# Altium footprint library Footprints.PcbLib: 45 footprints (part 1 of 3)
Each footprint in its own frame and in the unit in brackets; x right, y up, seen from the top. Pads: shape width x height; smd on the part's side, far side on the other; paste and mask are expansions set on the pad; w line width, h text height; cw(c..) or ccw(c..) is an arc to the next point about the centre after c.
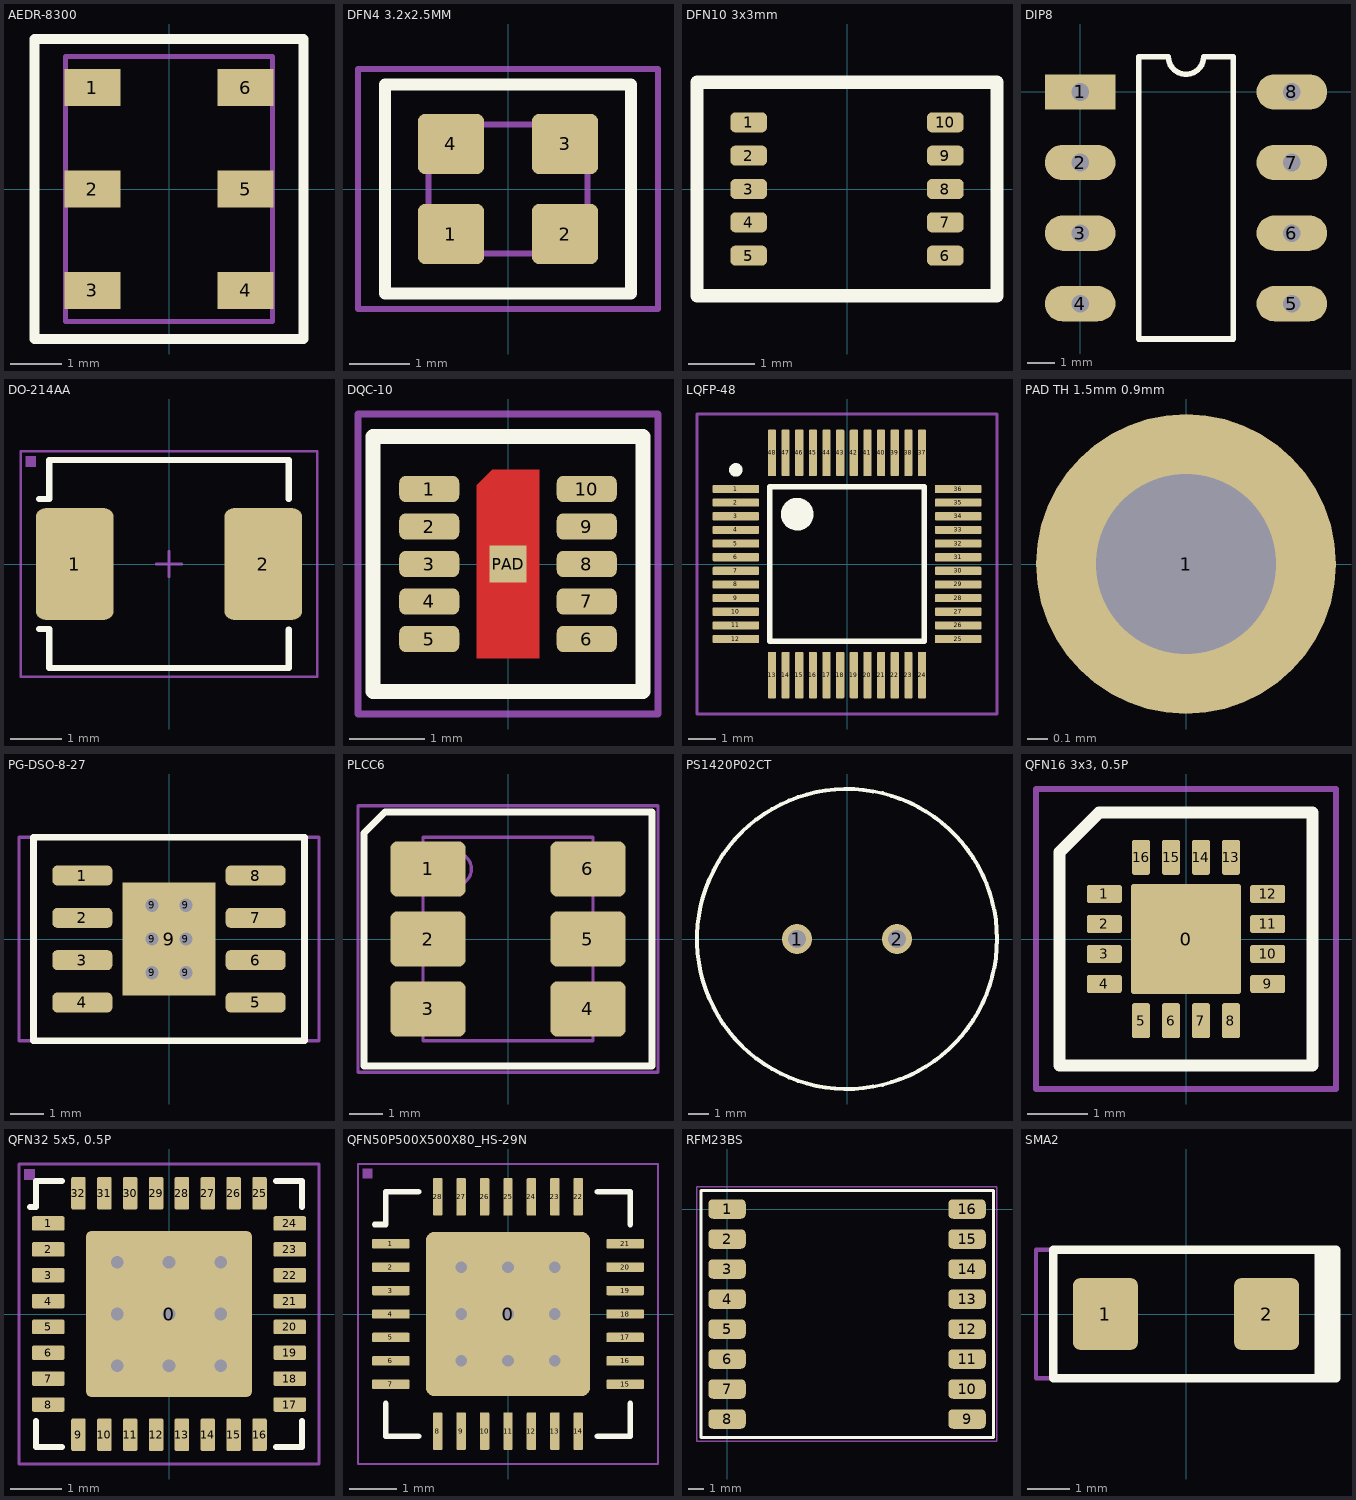
[diagram p0: the footprints below, top view; thin cyan lines are the x and y axes]

## AEDR-8300 [mm] "Avago"
height 1.6
pads (6):
  rect 1.08x0.72 smd: 1(-1.48,1.96) 2(-1.48,0) 3(-1.48,-1.96) 4(1.48,-1.96) 5(1.48,0) 6(1.48,1.96)
Top Overlay:
  lines w0.2: -2.6,-2.9 2.6,-2.9 2.6,2.9 -2.6,2.9 -2.6,-2.9
15. Courtyard TOP:
  lines w0.1: -2,-2.56 2,-2.56 2,2.56 -2,2.56 -2,-2.56
  text ".designator" at 0.5,-1 h1

## DFN4 3.2x2.5MM [mm] "2.5 x 3.2 mm 4-pin DFN"
height 0.9
pads (4):
  rrect23% 1.1x1 smd: 1(-0.95,-0.75) 2(0.95,-0.75) 3(0.95,0.75) 4(-0.95,0.75)
Top Overlay:
  lines w0.2: -2.05,-1.74 -2.05,1.74 2.05,1.74 2.05,-1.74 -2.05,-1.74
15. Courtyard TOP:
  lines w0.1: -2.5,-2 -2.5,2 2.5,2 2.5,-2 -2.5,-2
  text "." at -2.1,-1.6 h1
  text ".designator" at -1.8,-0.4 h1
17. Comp.body:
  lines w0.1: -1.325,-1.075 1.325,-1.075 1.325,1.075 -1.325,1.075 -1.325,-1.075

## DFN10 3x3mm [mm]
pads (10):
  rrect50% 0.55x0.3 smd: 1(-1.475,1) 2(-1.475,0.5) 3(-1.475,0) 4(-1.475,-0.5) 5(-1.475,-1) 6(1.475,-1) 7(1.475,-0.5) 8(1.475,0) 9(1.475,0.5) 10(1.475,1)
Top Overlay:
  lines w0.2: -2.25,-1.6 2.25,-1.6 2.25,1.6 -2.25,1.6 -2.25,-1.6
15. Courtyard TOP:
  lines w0.1: -2.25,-1.6 2.25,-1.6 2.25,1.6 -2.25,1.6 -2.25,-1.6
  text "." at -1.9,1.1 h1
  text ".designator" at -1.5,-0.5 h1
3D body: height 0.9, standoff 0, extent -1.5,-1.5 1.5,1.5

## DIP8 [mm]
pads (8):
  rect 2.54x1.27 hole 0.635: 1(0,0)
  oval 2.54x1.27 hole 0.635: 2(0,-2.54) 3(0,-5.08) 4(0,-7.62) 5(7.62,-7.62) 6(7.62,-5.08) 7(7.62,-2.54) 8(7.62,0)
Top Overlay:
  lines w0.2: 2.105,-8.89 5.515,-8.89 5.515,1.27 4.445,1.27 cw(c3.81,1.27) 3.175,1.27 2.105,1.27 2.105,-8.89

## DO-214AA [mm] "Molded Diode, 2-Leads, Body 4,31x3,62mm, IPC Medium Density"
height 2.44
pads (2):
  rrect23% 1.52x2.18 smd: 1(-1.84,0) 2(1.84,0)
Top Overlay:
  lines w0.12: -2.54,-1.27 -2.34,-1.27 -2.34,-2.03 2.34,-2.03 2.34,-1.28 ; -2.54,1.27 -2.34,1.27 -2.34,2.03 2.34,2.03 2.34,1.27
15. Courtyard TOP:
  lines w0.05: -0.25,0 0.25,0 ; 0,-0.25 0,0.25 ; -2.9,-2.2 -2.9,2.2 2.9,2.2 2.9,-2.2 -2.9,-2.2
18. Assembly TOP:
  region: -2.8,2.1 -2.6,2.1 -2.6,1.9 -2.8,1.9
  lines w0.05: -2.9,-2.2 -2.9,2.2 2.9,2.2 2.9,-2.2 -2.9,-2.2
  text ".designator" at -3.3,-0.7 h1.5
3D body: height 2.44, standoff 0, extent -2.285,-1.97 2.285,1.97

## DQC-10 [mm] "R-PWSON-N10"
height 0.8
pads (11):
  rrect50% 0.8x0.35 smd mask+0.02: 1(-1.05,1)
  rrect50% 0.8x0.35 smd paste+0 mask+0.02: 2(-1.05,0.5) 3(-1.05,0) 4(-1.05,-0.5) 5(-1.05,-1) 6(1.05,-1) 7(1.05,-0.5) 8(1.05,0) 9(1.05,0.5) 10(1.05,1)
  rect 0.5x0.5 smd paste+0 mask+0: PAD(0,0)
Top Layer:
  region: -0.42,-1.26 0.42,-1.26 0.42,1.26 -0.21,1.26 -0.42,1.05
Top Overlay:
  lines w0.2: -1.8,-1.7 -1.8,1.7 1.8,1.7 1.8,-1.7 -1.8,-1.7
15. Courtyard TOP:
  lines w0.1: -2,-2 2,-2 2,2 -2,2 -2,-2
  text ".designator" at 0.4,-1.3 h1

## LQFP-48 [mm]
pads (48):
  rrect23% 1.7x0.3 smd: 1(-4.075,2.75) 2(-4.075,2.25) 3(-4.075,1.75) 4(-4.075,1.25) 5(-4.075,0.75) 6(-4.075,0.25) 7(-4.075,-0.25) 8(-4.075,-0.75) 9(-4.075,-1.25) 10(-4.075,-1.75) 11(-4.075,-2.25) 12(-4.075,-2.75) 25(4.075,-2.75) 26(4.075,-2.25) 27(4.075,-1.75) 28(4.075,-1.25) 29(4.075,-0.75) 30(4.075,-0.25) 31(4.075,0.25) 32(4.075,0.75) 33(4.075,1.25) 34(4.075,1.75) 35(4.075,2.25) 36(4.075,2.75)
  rrect23% 0.3x1.7 smd: 13(-2.75,-4.075) 14(-2.25,-4.075) 15(-1.75,-4.075) 16(-1.25,-4.075) 17(-0.75,-4.075) 18(-0.25,-4.075) 19(0.25,-4.075) 20(0.75,-4.075) 21(1.25,-4.075) 22(1.75,-4.075) 23(2.25,-4.075) 24(2.75,-4.075) 37(2.75,4.075) 38(2.25,4.075) 39(1.75,4.075) 40(1.25,4.075) 41(0.75,4.075) 42(0.25,4.075) 43(-0.25,4.075) 44(-0.75,4.075) 45(-1.25,4.075) 46(-1.75,4.075) 47(-2.25,4.075) 48(-2.75,4.075)
Top Overlay:
  circle w0.6: c-1.825,1.825 r0.3
  circle w0.25: c-4.075,3.45 r0.125
  lines w0.2: -2.825,-2.825 2.825,-2.825 2.825,2.825 -2.825,2.825 -2.825,-2.825
15. Courtyard TOP:
  lines w0.1: -5.5,-5.5 5.5,-5.5 5.5,5.5 -5.5,5.5 -5.5,-5.5
  text "." at -4,4 h1
  text ".designator" at -3,-1 h2
3D body: height 1.6, standoff 0, extent -4.5,-4.5 4.5,4.5

## PAD TH 1.5mm 0.9mm [mm] "Pad through-hole OAR 1.5mm HOLE 0.9mm"
pads (1):
  round 1.5 hole 0.9: 1(0,0)

## PG-DSO-8-27 [mm]
height 1.7
pads (15):
  rrect50% 1.8x0.6 smd: 1(-2.6,1.905) 2(-2.6,0.635) 3(-2.6,-0.635) 4(-2.6,-1.905) 5(2.6,-1.905) 6(2.6,-0.635) 7(2.6,0.635) 8(2.6,1.905)
  round 0.4 hole 0.4: 9(-0.508,-1.016) 9(-0.508,0) 9(-0.508,1.016) 9(0.508,-1.016) 9(0.508,0) 9(0.508,1.016)
  rect 2.8x3.4 smd: 9(0,0)
Top Overlay:
  lines w0.2: -4.064,-3.048 -4.064,3.048 4.064,3.048 4.064,-3.048 -4.064,-3.048
15. Courtyard TOP:
  lines w0.1: -4.5,-3.048 4.5,-3.048 4.5,3.048 -4.5,3.048 -4.5,-3.048
  text ".designator" at -1.524,-1.016 h2
  text "." at -3.3,2.4 h1
3D body: height 1.75, standoff 0, extent -3,-2.45 3,2.45

## PLCC6 [mm] "SOJ, 6-Leads, Body 6.1x5.8mm (max), Pitch 2.10mm, IPC Low Density"
height 2.6
pads (6):
  rrect23% 2.25x1.65 smd: 1(-2.4,2.1) 2(-2.4,0) 3(-2.4,-2.1) 4(2.4,-2.1) 5(2.4,0) 6(2.4,2.1)
Top Overlay:
  lines w0.2: -4.318,-3.81 4.318,-3.81 4.318,3.81 -3.69,3.81 -4.318,3.182 -4.318,-3.81
13. 3D Model TOP:
  circle w0.1: c-1.6,2.1 r0.5
  lines w0.1: -2.55,-3.05 -2.55,3.05 2.55,3.05 2.55,-3.05 -2.55,-3.05
15. Courtyard TOP:
  lines w0.1: -4.5,-4 4.5,-4 4.5,4 -4.5,4 -4.5,-4
  text "." at -3.5,2.8 h1
  text ".designator" at -2,-1 h2
3D body: height 2.6, standoff 0, extent -2.96,-2.75 2.54,2.75

## PS1420P02CT [mm] "Piezo speaker"
height 11
pads (2):
  round 1.5 hole 0.9: 1(-2.5,0) 2(2.5,0)
Top Overlay:
  circle w0.2: c0,0 r7.5
3D body: height 11, standoff 0, extent -6.945,-6.986 7,6.986

## QFN16 3x3, 0.5P [mm]
pads (17):
  rrect6% 1.84x1.84 smd: 0(0,0)
  rrect23% 0.58x0.3 smd: 1(-1.36,0.75) 2(-1.36,0.25) 3(-1.36,-0.25) 4(-1.36,-0.75) 9(1.36,-0.75) 10(1.36,-0.25) 11(1.36,0.25) 12(1.36,0.75)
  rrect23% 0.3x0.58 smd: 5(-0.75,-1.36) 6(-0.25,-1.36) 7(0.25,-1.36) 8(0.75,-1.36) 13(0.75,1.36) 14(0.25,1.36) 15(-0.25,1.36) 16(-0.75,1.36)
Top Overlay:
  lines w0.2: -2.108,-2.108 -2.108,1.448 -1.448,2.108 2.108,2.108 2.108,-2.108 -2.108,-2.108
15. Courtyard TOP:
  lines w0.1: -2.5,-2.5 2.5,-2.5 2.5,2.5 -2.5,2.5 -2.5,-2.5
  text ".Designator" at -0.9,-0.4 h1
  text "." at -1.4,1.3 h1
3D body: height 0.9, standoff 0, extent -1.501,-1.501 1.501,1.501

## QFN32 5x5, 0.5P [mm]
pads (33):
  rrect5% 3.2x3.2 smd: 0(0,0)
  rrect23% 0.63x0.28 smd mask+0.05: 1(-2.335,1.75) 2(-2.335,1.25) 3(-2.335,0.75) 4(-2.335,0.25) 5(-2.335,-0.25) 6(-2.335,-0.75) 7(-2.335,-1.25) 8(-2.335,-1.75) 17(2.335,-1.75) 18(2.335,-1.25) 19(2.335,-0.75) 20(2.335,-0.25) 21(2.335,0.25) 22(2.335,0.75) 23(2.335,1.25) 24(2.335,1.75)
  rrect23% 0.28x0.63 smd mask+0.05: 9(-1.75,-2.335) 10(-1.25,-2.335) 11(-0.75,-2.335) 12(-0.25,-2.335) 13(0.25,-2.335) 14(0.75,-2.335) 15(1.25,-2.335) 16(1.75,-2.335) 25(1.75,2.335) 26(1.25,2.335) 27(0.75,2.335) 28(0.25,2.335) 29(-0.25,2.335) 30(-0.75,2.335) 31(-1.25,2.335) 32(-1.75,2.335)
via 0,0 diameter 0.5 hole 0.25
via -1,1 diameter 0.5 hole 0.25
via 0,1 diameter 0.5 hole 0.25
via 1,1 diameter 0.5 hole 0.25
via -1,0 diameter 0.5 hole 0.25
via 1,0 diameter 0.5 hole 0.25
via -1,-1 diameter 0.5 hole 0.25
via 0,-1 diameter 0.5 hole 0.25
via 1,-1 diameter 0.5 hole 0.25
Top Overlay:
  lines w0.12: -2.69,2.07 -2.57,2.07 -2.57,2.57 -2.07,2.57 ; -2.57,-2.07 -2.57,-2.57 -2.07,-2.57 ; 2.07,-2.57 2.57,-2.57 2.57,-2.07 ; 2.07,2.57 2.57,2.57 2.57,2.07
15. Courtyard TOP:
  lines w0.05: -0.25,0 0.25,0 ; 0,-0.25 0,0.25 ; -2.9,-2.9 2.9,-2.9 2.9,2.9 -2.9,2.9 -2.9,-2.9
18. Assembly TOP:
  region: -2.8,2.8 -2.6,2.8 -2.6,2.6 -2.8,2.6
  lines w0.05: -2.9,-2.9 -2.9,2.9 2.9,2.9 2.9,-2.9 -2.9,-2.9
  text "IC200" at -2.3,-0.5 h1
3D body: height 0.8, standoff 0, extent -2.51,-2.51 2.51,2.51

## QFN50P500X500X80_HS-29N [mm] "QFN, 28-Leads, Body 5,00x5,00mm, Pitch 0,50mm, Thermal Pad 3,50x3,50mm, IPC Medium Density"
height 0.8
pads (29):
  rrect10% 3.5x3.5 smd: 0(0,0)
  rrect23% 0.8x0.2 smd mask+0.1: 1(-2.5,1.5) 2(-2.5,1) 3(-2.5,0.5) 4(-2.5,0) 5(-2.5,-0.5) 6(-2.5,-1) 7(-2.5,-1.5) 15(2.5,-1.5) 16(2.5,-1) 17(2.5,-0.5) 18(2.5,0) 19(2.5,0.5) 20(2.5,1) 21(2.5,1.5)
  rrect23% 0.2x0.8 smd mask+0.1: 8(-1.5,-2.5) 9(-1,-2.5) 10(-0.5,-2.5) 11(0,-2.5) 12(0.5,-2.5) 13(1,-2.5) 14(1.5,-2.5) 22(1.5,2.5) 23(1,2.5) 24(0.5,2.5) 25(0,2.5) 26(-0.5,2.5) 27(-1,2.5) 28(-1.5,2.5)
via -1,1 diameter 0.5 hole 0.25
via 0,0 diameter 0.5 hole 0.25
via 0,1 diameter 0.5 hole 0.25
via 1,1 diameter 0.5 hole 0.25
via -1,0 diameter 0.5 hole 0.25
via -1,-1 diameter 0.5 hole 0.25
via 0,-1 diameter 0.5 hole 0.25
via 1,0 diameter 0.5 hole 0.25
via 1,-1 diameter 0.5 hole 0.25
Top Overlay:
  lines w0.12: -2.84,1.91 -2.61,1.91 -2.61,2.61 -1.91,2.61 ; -2.61,-1.91 -2.61,-2.61 -1.91,-2.61 ; 1.91,-2.61 2.61,-2.61 2.61,-1.91 ; 1.91,2.61 2.61,2.61 2.61,1.91
15. Courtyard TOP:
  lines w0.05: -0.25,0 0.25,0 ; 0,-0.25 0,0.25 ; -3.2,-3.2 -3.2,3.2 3.2,3.2 3.2,-3.2 -3.2,-3.2
18. Assembly TOP:
  region: -3.1,3.1 -2.9,3.1 -2.9,2.9 -3.1,2.9
  lines w0.05: -3.2,-3.2 -3.2,3.2 3.2,3.2 3.2,-3.2 -3.2,-3.2
  text ".designator" at -2.2,-0.4 h1
3D body: height 0.8, standoff 0.05, extent -2.55,-2.55 2.55,2.55

## RFM23BS [mm]
pads (16):
  rrect50% 2.5x1.3 smd: 1(0,0) 2(0,-2) 3(0,-4) 4(0,-6) 5(0,-8) 6(0,-10) 7(0,-12) 8(0,-14) 9(16,-14) 10(16,-12) 11(16,-10) 12(16,-8) 13(16,-6) 14(16,-4) 15(16,-2) 16(16,0)
Top Overlay:
  lines w0.2: -1.75,-15.25 -1.75,1.25 17.75,1.25 17.75,-15.25 -1.75,-15.25
15. Courtyard TOP:
  lines w0.1: -2,-15.5 18,-15.5 18,1.5 -2,1.5 -2,-15.5
  text ".designator" at 5.5,-7.75 h5
  text "." at -0.1,-0.1 h1

## SMA2 [mm]
pads (2):
  rrect23% 1.52x1.68 smd: 1(-1.88,0) 2(1.88,0)
Top Overlay:
  lines w0.2: 3.1,-1.5 3.3,-1.5 ; 3.1,-1.5 3.1,1.5 ; 3.1,-1.5 -3.1,-1.5 -3.1,1.5 3.1,1.5 ; 3.1,1.5 3.3,1.5 ; 3.3,-1.5 3.5,-1.5 3.5,1.5 3.3,1.5 ; 3.3,-1.5 3.3,1.5
15. Courtyard TOP:
  lines w0.1: -3.5,-1.5 -3.5,1.5 3.5,1.5 3.5,-1.5 -3.5,-1.5
  text "." at -2.6,-0.1 h1
  text ".designator" at -1.3,-0.5 h1
3D body: height 2.32, standoff 0.02, extent -2.6,-1.45 2.6,1.45